# Altium schematic symbol library jlcpcb_2025_04_ferrites_extended_0603.schlib: 833 symbols (part 3 of 4) (continued)
## HCB1608KF-121T20
designator FB?  Impedance @ Frequency: 120Ω@100MHz
Ferrite, 120Ω@100MHz, 2A, SMD 0603; Manufacturer: TAI-TECH; Manufacturer Part Number: HCB1608KF-121T20; Package Size: 0603; JLCPCB Basic Part: No; JLCPCB Part Number: C127301; Supplier 1: LCSC; Category: Ferrite Beads; Supplier Part Number 1: C127301; Rated Current: 2A; RoHS: Yes; ComponentLink1Description: Datasheet; ComponentLink2Description: JLCPCB Part URL; ComponentLink2URL: https://jlcpcb.com/partdetail/C127301; ComponentLink3Description: LCSC Part URL; ComponentLink3URL: https://lcsc.com/product-detail/Ferrite-Beads_TAI-TECH-TAI-TECH-HCB1608KF-121T20_C127301.html
pins: 1, 2

## HCB1608KF-121T30
designator FB?  Impedance @ Frequency: 120Ω@100MHz
Ferrite, 120Ω@100MHz, ±25%, 100mΩ, 3A, SMD 0603; Manufacturer: TAI-TECH; Manufacturer Part Number: HCB1608KF-121T30; Package Size: 0603; JLCPCB Basic Part: No; JLCPCB Part Number: C353920; Supplier 1: LCSC; Category: Ferrite Beads; Supplier Part Number 1: C353920; Tolerance: ±25%; Rated Current: 3A; DC Resistance: 100mΩ; RoHS: Yes; ComponentLink1Description: Datasheet; ComponentLink1URL: https://wmsc.lcsc.com/wmsc/upload/file/pdf/v2/lcsc/2009171106_TAI-TECH-HCB1608KF-121T30_C353920.pdf; ComponentLink2Description: JLCPCB Part URL; ComponentLink2URL: https://jlcpcb.com/partdetail/C353920; ComponentLink3Description: LCSC Part URL; ComponentLink3URL: https://lcsc.com/product-detail/Ferrite-Beads_TAI-TECH-TAI-TECH-HCB1608KF-121T30_C353920.html
footprint FB-0603 (0603 (1608M) Ferrite)
pins: 1, 2

## HCB1608KF-151T20
designator FB?  Impedance @ Frequency: 150Ω@100MHz
Ferrite, 150Ω@100MHz, ±25%, 100mΩ, 2A, SMD 0603; Manufacturer: TAI-TECH; Manufacturer Part Number: HCB1608KF-151T20; Package Size: 0603; JLCPCB Basic Part: No; JLCPCB Part Number: C356965; Supplier 1: LCSC; Category: Ferrite Beads; Supplier Part Number 1: C356965; Tolerance: ±25%; Rated Current: 2A; DC Resistance: 100mΩ; RoHS: Yes; ComponentLink1Description: Datasheet; ComponentLink1URL: https://wmsc.lcsc.com/wmsc/upload/file/pdf/v2/lcsc/2009171138_TAI-TECH-HCB1608KF-151T20_C356965.pdf; ComponentLink2Description: JLCPCB Part URL; ComponentLink2URL: https://jlcpcb.com/partdetail/C356965; ComponentLink3Description: LCSC Part URL; ComponentLink3URL: https://lcsc.com/product-detail/Ferrite-Beads_TAI-TECH-TAI-TECH-HCB1608KF-151T20_C356965.html
footprint FB-0603 (0603 (1608M) Ferrite)
pins: 1, 2

## HCB1608KF-181T20
designator FB?  Impedance @ Frequency: 180Ω@100MHz
Ferrite, 180Ω@100MHz, ±25%, 100mΩ, 2A, SMD 0603; Manufacturer: TAI-TECH; Manufacturer Part Number: HCB1608KF-181T20; Package Size: 0603; JLCPCB Basic Part: No; JLCPCB Part Number: C356967; Supplier 1: LCSC; Category: Ferrite Beads; Supplier Part Number 1: C356967; Tolerance: ±25%; Rated Current: 2A; DC Resistance: 100mΩ; RoHS: Yes; ComponentLink1Description: Datasheet; ComponentLink1URL: https://wmsc.lcsc.com/wmsc/upload/file/pdf/v2/lcsc/2009171138_TAI-TECH-HCB1608KF-181T20_C356967.pdf; ComponentLink2Description: JLCPCB Part URL; ComponentLink2URL: https://jlcpcb.com/partdetail/C356967; ComponentLink3Description: LCSC Part URL; ComponentLink3URL: https://lcsc.com/product-detail/Ferrite-Beads_TAI-TECH-TAI-TECH-HCB1608KF-181T20_C356967.html
footprint FB-0603 (0603 (1608M) Ferrite)
pins: 1, 2

## HCB1608KF-190T40
designator FB?  Impedance @ Frequency: 19Ω@100MHz
Ferrite, 19Ω@100MHz, ±25%, 30mΩ, 4A, SMD 0603; Manufacturer: TAI-TECH; Manufacturer Part Number: HCB1608KF-190T40; Package Size: 0603; JLCPCB Basic Part: No; JLCPCB Part Number: C369513; Supplier 1: LCSC; Category: Ferrite Beads; Supplier Part Number 1: C369513; Tolerance: ±25%; Rated Current: 4A; DC Resistance: 30mΩ; RoHS: Yes; ComponentLink1Description: Datasheet; ComponentLink1URL: https://wmsc.lcsc.com/wmsc/upload/file/pdf/v2/lcsc/2009171441_TAI-TECH-HCB1608KF-190T40_C369513.pdf; ComponentLink2Description: JLCPCB Part URL; ComponentLink2URL: https://jlcpcb.com/partdetail/C369513; ComponentLink3Description: LCSC Part URL; ComponentLink3URL: https://lcsc.com/product-detail/Ferrite-Beads_TAI-TECH-TAI-TECH-HCB1608KF-190T40_C369513.html
footprint FB-0603 (0603 (1608M) Ferrite)
pins: 1, 2

## HCB1608KF-221T20
designator FB?  Impedance @ Frequency: 220Ω@100MHz
Ferrite, 220Ω@100MHz, ±25%, 100mΩ, 2A, SMD 0603; Manufacturer: TAI-TECH; Manufacturer Part Number: HCB1608KF-221T20; Package Size: 0603; JLCPCB Basic Part: No; JLCPCB Part Number: C304314; Supplier 1: LCSC; Category: Ferrite Beads; Supplier Part Number 1: C304314; Tolerance: ±25%; Rated Current: 2A; DC Resistance: 100mΩ; RoHS: Yes; ComponentLink1Description: Datasheet; ComponentLink1URL: https://wmsc.lcsc.com/wmsc/upload/file/pdf/v2/lcsc/2009171410_TAI-TECH-HCB1608KF-221T20_C304314.pdf; ComponentLink2Description: JLCPCB Part URL; ComponentLink2URL: https://jlcpcb.com/partdetail/C304314; ComponentLink3Description: LCSC Part URL; ComponentLink3URL: https://lcsc.com/product-detail/Ferrite-Beads_TAI-TECH-TAI-TECH-HCB1608KF-221T20_C304314.html
footprint FB-0603 (0603 (1608M) Ferrite)
pins: 1, 2

## HCB1608KF-300T20
designator FB?  Impedance @ Frequency: 30Ω@100MHz
Ferrite, 30Ω@100MHz, 2A, SMD 0603; Manufacturer: TAI-TECH; Manufacturer Part Number: HCB1608KF-300T20; Package Size: 0603; JLCPCB Basic Part: No; JLCPCB Part Number: C127306; Supplier 1: LCSC; Category: Ferrite Beads; Supplier Part Number 1: C127306; Rated Current: 2A; RoHS: Yes; ComponentLink1Description: Datasheet; ComponentLink2Description: JLCPCB Part URL; ComponentLink2URL: https://jlcpcb.com/partdetail/C127306; ComponentLink3Description: LCSC Part URL; ComponentLink3URL: https://lcsc.com/product-detail/Ferrite-Beads_TAI-TECH-TAI-TECH-HCB1608KF-300T20_C127306.html
pins: 1, 2

## HCB1608KF-300T30
designator FB?  Impedance @ Frequency: 30Ω@100MHz
Ferrite, 30Ω@100MHz, ±25%, 40mΩ, 3A, SMD 0603; Manufacturer: TAI-TECH; Manufacturer Part Number: HCB1608KF-300T30; Package Size: 0603; JLCPCB Basic Part: No; JLCPCB Part Number: C304315; Supplier 1: LCSC; Category: Ferrite Beads; Supplier Part Number 1: C304315; Tolerance: ±25%; Rated Current: 3A; DC Resistance: 40mΩ; RoHS: Yes; ComponentLink1Description: Datasheet; ComponentLink1URL: https://wmsc.lcsc.com/wmsc/upload/file/pdf/v2/lcsc/2009171410_TAI-TECH-HCB1608KF-300T30_C304315.pdf; ComponentLink2Description: JLCPCB Part URL; ComponentLink2URL: https://jlcpcb.com/partdetail/C304315; ComponentLink3Description: LCSC Part URL; ComponentLink3URL: https://lcsc.com/product-detail/Ferrite-Beads_TAI-TECH-TAI-TECH-HCB1608KF-300T30_C304315.html
footprint FB-0603 (0603 (1608M) Ferrite)
pins: 1, 2

## HCB1608KF-300T50
designator FB?  Impedance @ Frequency: 30Ω@100MHz
Ferrite, 30Ω@100MHz, ±25%, 20mΩ, 5A, SMD 0603; Manufacturer: TAI-TECH; Manufacturer Part Number: HCB1608KF-300T50; Package Size: 0603; JLCPCB Basic Part: No; JLCPCB Part Number: C356971; Supplier 1: LCSC; Category: Ferrite Beads; Supplier Part Number 1: C356971; Tolerance: ±25%; Rated Current: 5A; DC Resistance: 20mΩ; RoHS: Yes; ComponentLink1Description: Datasheet; ComponentLink1URL: https://wmsc.lcsc.com/wmsc/upload/file/pdf/v2/lcsc/2009171138_TAI-TECH-HCB1608KF-300T50_C356971.pdf; ComponentLink2Description: JLCPCB Part URL; ComponentLink2URL: https://jlcpcb.com/partdetail/C356971; ComponentLink3Description: LCSC Part URL; ComponentLink3URL: https://lcsc.com/product-detail/Ferrite-Beads_TAI-TECH-TAI-TECH-HCB1608KF-300T50_C356971.html
footprint FB-0603 (0603 (1608M) Ferrite)
pins: 1, 2

## HCB1608KF-301T10
designator FB?  Impedance @ Frequency: 300Ω@100MHz
Ferrite, 300Ω@100MHz, ±25%, 200mΩ, 1A, SMD 0603; Manufacturer: TAI-TECH; Manufacturer Part Number: HCB1608KF-301T10; Package Size: 0603; JLCPCB Basic Part: No; JLCPCB Part Number: C2992341; Supplier 1: LCSC; Category: Ferrite Beads; Supplier Part Number 1: C2992341; Tolerance: ±25%; Rated Current: 1A; DC Resistance: 200mΩ; RoHS: Yes; ComponentLink1Description: Datasheet; ComponentLink2Description: JLCPCB Part URL; ComponentLink2URL: https://jlcpcb.com/partdetail/C2992341; ComponentLink3Description: LCSC Part URL; ComponentLink3URL: https://lcsc.com/product-detail/Ferrite-Beads_TAI-TECH-TAI-TECH-HCB1608KF-301T10_C2992341.html
footprint FB-0603 (0603 (1608M) Ferrite)
pins: 1, 2

## HCB1608KF-301T20
designator FB?  Impedance @ Frequency: 300Ω@100MHz
Ferrite, 300Ω@100MHz, ±25%, 100mΩ, 2A, SMD 0603; Manufacturer: TAI-TECH; Manufacturer Part Number: HCB1608KF-301T20; Package Size: 0603; JLCPCB Basic Part: No; JLCPCB Part Number: C304316; Supplier 1: LCSC; Category: Ferrite Beads; Supplier Part Number 1: C304316; Tolerance: ±25%; Rated Current: 2A; DC Resistance: 100mΩ; RoHS: Yes; ComponentLink1Description: Datasheet; ComponentLink1URL: https://wmsc.lcsc.com/wmsc/upload/file/pdf/v2/lcsc/2009171410_TAI-TECH-HCB1608KF-301T20_C304316.pdf; ComponentLink2Description: JLCPCB Part URL; ComponentLink2URL: https://jlcpcb.com/partdetail/C304316; ComponentLink3Description: LCSC Part URL; ComponentLink3URL: https://lcsc.com/product-detail/Ferrite-Beads_TAI-TECH-TAI-TECH-HCB1608KF-301T20_C304316.html
footprint FB-0603 (0603 (1608M) Ferrite)
pins: 1, 2

## HCB1608KF-331T20
designator FB?  Impedance @ Frequency: 330Ω@100MHz
Ferrite, 330Ω@100MHz, ±25%, 100mΩ, 2A, SMD 0603; Manufacturer: TAI-TECH; Manufacturer Part Number: HCB1608KF-331T20; Package Size: 0603; JLCPCB Basic Part: No; JLCPCB Part Number: C356973; Supplier 1: LCSC; Category: Ferrite Beads; Supplier Part Number 1: C356973; Tolerance: ±25%; Rated Current: 2A; DC Resistance: 100mΩ; RoHS: Yes; ComponentLink1Description: Datasheet; ComponentLink1URL: https://wmsc.lcsc.com/wmsc/upload/file/pdf/v2/lcsc/2009171138_TAI-TECH-HCB1608KF-331T20_C356973.pdf; ComponentLink2Description: JLCPCB Part URL; ComponentLink2URL: https://jlcpcb.com/partdetail/C356973; ComponentLink3Description: LCSC Part URL; ComponentLink3URL: https://lcsc.com/product-detail/Ferrite-Beads_TAI-TECH-TAI-TECH-HCB1608KF-331T20_C356973.html
footprint FB-0603 (0603 (1608M) Ferrite)
pins: 1, 2

## HCB1608KF-391T10
designator FB?  Impedance @ Frequency: 390Ω@100MHz
Ferrite, 390Ω@100MHz, ±25%, 200mΩ, 1A, SMD 0603; Manufacturer: TAI-TECH; Manufacturer Part Number: HCB1608KF-391T10; Package Size: 0603; JLCPCB Basic Part: No; JLCPCB Part Number: C369514; Supplier 1: LCSC; Category: Ferrite Beads; Supplier Part Number 1: C369514; Tolerance: ±25%; Rated Current: 1A; DC Resistance: 200mΩ; RoHS: Yes; ComponentLink1Description: Datasheet; ComponentLink1URL: https://wmsc.lcsc.com/wmsc/upload/file/pdf/v2/lcsc/2009171441_TAI-TECH-HCB1608KF-391T10_C369514.pdf; ComponentLink2Description: JLCPCB Part URL; ComponentLink2URL: https://jlcpcb.com/partdetail/C369514; ComponentLink3Description: LCSC Part URL; ComponentLink3URL: https://lcsc.com/product-detail/Ferrite-Beads_TAI-TECH-TAI-TECH-HCB1608KF-391T10_C369514.html
footprint FB-0603 (0603 (1608M) Ferrite)
pins: 1, 2

## HCB1608KF-401T10
designator FB?  Impedance @ Frequency: 400Ω@100MHz
Ferrite, 400Ω@100MHz, ±25%, 200mΩ, 1A, SMD 0603; Manufacturer: TAI-TECH; Manufacturer Part Number: HCB1608KF-401T10; Package Size: 0603; JLCPCB Basic Part: No; JLCPCB Part Number: C356975; Supplier 1: LCSC; Category: Ferrite Beads; Supplier Part Number 1: C356975; Tolerance: ±25%; Rated Current: 1A; DC Resistance: 200mΩ; RoHS: Yes; ComponentLink1Description: Datasheet; ComponentLink1URL: https://wmsc.lcsc.com/wmsc/upload/file/pdf/v2/lcsc/2009171138_TAI-TECH-HCB1608KF-401T10_C356975.pdf; ComponentLink2Description: JLCPCB Part URL; ComponentLink2URL: https://jlcpcb.com/partdetail/C356975; ComponentLink3Description: LCSC Part URL; ComponentLink3URL: https://lcsc.com/product-detail/Ferrite-Beads_TAI-TECH-TAI-TECH-HCB1608KF-401T10_C356975.html
footprint FB-0603 (0603 (1608M) Ferrite)
pins: 1, 2

## HCB1608KF-470T30
designator FB?  Impedance @ Frequency: 47Ω@100MHz
Ferrite, 47Ω@100MHz, ±25%, 40mΩ, 3A, SMD 0603; Manufacturer: TAI-TECH; Manufacturer Part Number: HCB1608KF-470T30; Package Size: 0603; JLCPCB Basic Part: No; JLCPCB Part Number: C356976; Supplier 1: LCSC; Category: Ferrite Beads; Supplier Part Number 1: C356976; Tolerance: ±25%; Rated Current: 3A; DC Resistance: 40mΩ; RoHS: Yes; ComponentLink1Description: Datasheet; ComponentLink1URL: https://wmsc.lcsc.com/wmsc/upload/file/pdf/v2/lcsc/2009171138_TAI-TECH-HCB1608KF-470T30_C356976.pdf; ComponentLink2Description: JLCPCB Part URL; ComponentLink2URL: https://jlcpcb.com/partdetail/C356976; ComponentLink3Description: LCSC Part URL; ComponentLink3URL: https://lcsc.com/product-detail/Ferrite-Beads_TAI-TECH-TAI-TECH-HCB1608KF-470T30_C356976.html
footprint FB-0603 (0603 (1608M) Ferrite)
pins: 1, 2

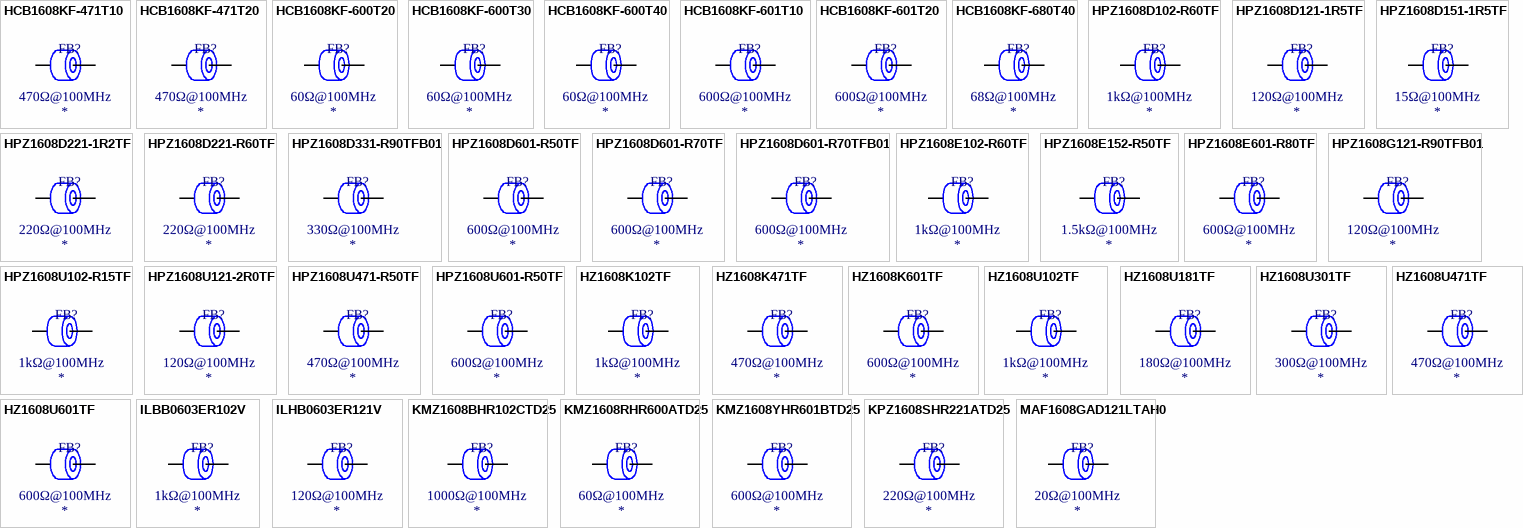
[diagram p12: symbols HCB1608KF-471T10 to MAF1608GAD121LTAH0]

## HCB1608KF-471T10
designator FB?  Impedance @ Frequency: 470Ω@100MHz
Ferrite, 470Ω@100MHz, ±25%, 200mΩ, 1A, SMD 0603; Manufacturer: TAI-TECH; Manufacturer Part Number: HCB1608KF-471T10; Package Size: 0603; JLCPCB Basic Part: No; JLCPCB Part Number: C369515; Supplier 1: LCSC; Category: Ferrite Beads; Supplier Part Number 1: C369515; Tolerance: ±25%; Rated Current: 1A; DC Resistance: 200mΩ; RoHS: Yes; ComponentLink1Description: Datasheet; ComponentLink1URL: https://wmsc.lcsc.com/wmsc/upload/file/pdf/v2/lcsc/2009171441_TAI-TECH-HCB1608KF-471T10_C369515.pdf; ComponentLink2Description: JLCPCB Part URL; ComponentLink2URL: https://jlcpcb.com/partdetail/C369515; ComponentLink3Description: LCSC Part URL; ComponentLink3URL: https://lcsc.com/product-detail/Ferrite-Beads_TAI-TECH-TAI-TECH-HCB1608KF-471T10_C369515.html
footprint FB-0603 (0603 (1608M) Ferrite)
pins: 1, 2

## HCB1608KF-471T20
designator FB?  Impedance @ Frequency: 470Ω@100MHz
Ferrite, 470Ω@100MHz, ±25%, 100mΩ, 2A, SMD 0603; Manufacturer: TAI-TECH; Manufacturer Part Number: HCB1608KF-471T20; Package Size: 0603; JLCPCB Basic Part: No; JLCPCB Part Number: C356977; Supplier 1: LCSC; Category: Ferrite Beads; Supplier Part Number 1: C356977; Tolerance: ±25%; Rated Current: 2A; DC Resistance: 100mΩ; RoHS: Yes; ComponentLink1Description: Datasheet; ComponentLink1URL: https://wmsc.lcsc.com/wmsc/upload/file/pdf/v2/lcsc/2009171138_TAI-TECH-HCB1608KF-471T20_C356977.pdf; ComponentLink2Description: JLCPCB Part URL; ComponentLink2URL: https://jlcpcb.com/partdetail/C356977; ComponentLink3Description: LCSC Part URL; ComponentLink3URL: https://lcsc.com/product-detail/Ferrite-Beads_TAI-TECH-TAI-TECH-HCB1608KF-471T20_C356977.html
footprint FB-0603 (0603 (1608M) Ferrite)
pins: 1, 2

## HCB1608KF-600T20
designator FB?  Impedance @ Frequency: 60Ω@100MHz
Ferrite, 60Ω@100MHz, ±25%, 100mΩ, 2A, SMD 0603; Manufacturer: TAI-TECH; Manufacturer Part Number: HCB1608KF-600T20; Package Size: 0603; JLCPCB Basic Part: No; JLCPCB Part Number: C369516; Supplier 1: LCSC; Category: Ferrite Beads; Supplier Part Number 1: C369516; Tolerance: ±25%; Rated Current: 2A; DC Resistance: 100mΩ; RoHS: Yes; ComponentLink1Description: Datasheet; ComponentLink1URL: https://wmsc.lcsc.com/wmsc/upload/file/pdf/v2/lcsc/2009171441_TAI-TECH-HCB1608KF-600T20_C369516.pdf; ComponentLink2Description: JLCPCB Part URL; ComponentLink2URL: https://jlcpcb.com/partdetail/C369516; ComponentLink3Description: LCSC Part URL; ComponentLink3URL: https://lcsc.com/product-detail/Ferrite-Beads_TAI-TECH-TAI-TECH-HCB1608KF-600T20_C369516.html
footprint FB-0603 (0603 (1608M) Ferrite)
pins: 1, 2

## HCB1608KF-600T30
designator FB?  Impedance @ Frequency: 60Ω@100MHz
Ferrite, 60Ω@100MHz, ±25%, 40mΩ, 3A, SMD 0603; Manufacturer: TAI-TECH; Manufacturer Part Number: HCB1608KF-600T30; Package Size: 0603; JLCPCB Basic Part: No; JLCPCB Part Number: C304317; Supplier 1: LCSC; Category: Ferrite Beads; Supplier Part Number 1: C304317; Tolerance: ±25%; Rated Current: 3A; DC Resistance: 40mΩ; RoHS: Yes; ComponentLink1Description: Datasheet; ComponentLink1URL: https://wmsc.lcsc.com/wmsc/upload/file/pdf/v2/lcsc/2009171410_TAI-TECH-HCB1608KF-600T30_C304317.pdf; ComponentLink2Description: JLCPCB Part URL; ComponentLink2URL: https://jlcpcb.com/partdetail/C304317; ComponentLink3Description: LCSC Part URL; ComponentLink3URL: https://lcsc.com/product-detail/Ferrite-Beads_TAI-TECH-TAI-TECH-HCB1608KF-600T30_C304317.html
footprint FB-0603 (0603 (1608M) Ferrite)
pins: 1, 2

## HCB1608KF-600T40
designator FB?  Impedance @ Frequency: 60Ω@100MHz
Ferrite, 60Ω@100MHz, ±25%, 30mΩ, 4A, SMD 0603; Manufacturer: TAI-TECH; Manufacturer Part Number: HCB1608KF-600T40; Package Size: 0603; JLCPCB Basic Part: No; JLCPCB Part Number: C356980; Supplier 1: LCSC; Category: Ferrite Beads; Supplier Part Number 1: C356980; Tolerance: ±25%; Rated Current: 4A; DC Resistance: 30mΩ; RoHS: Yes; ComponentLink1Description: Datasheet; ComponentLink1URL: https://wmsc.lcsc.com/wmsc/upload/file/pdf/v2/lcsc/2009171138_TAI-TECH-HCB1608KF-600T40_C356980.pdf; ComponentLink2Description: JLCPCB Part URL; ComponentLink2URL: https://jlcpcb.com/partdetail/C356980; ComponentLink3Description: LCSC Part URL; ComponentLink3URL: https://lcsc.com/product-detail/Ferrite-Beads_TAI-TECH-TAI-TECH-HCB1608KF-600T40_C356980.html
footprint FB-0603 (0603 (1608M) Ferrite)
pins: 1, 2

## HCB1608KF-601T10
designator FB?  Impedance @ Frequency: 600Ω@100MHz
Ferrite, 600Ω@100MHz, ±25%, 200mΩ, 1A, SMD 0603; Manufacturer: TAI-TECH; Manufacturer Part Number: HCB1608KF-601T10; Package Size: 0603; JLCPCB Basic Part: No; JLCPCB Part Number: C304318; Supplier 1: LCSC; Category: Ferrite Beads; Supplier Part Number 1: C304318; Tolerance: ±25%; Rated Current: 1A; DC Resistance: 200mΩ; RoHS: Yes; ComponentLink1Description: Datasheet; ComponentLink1URL: https://wmsc.lcsc.com/wmsc/upload/file/pdf/v2/lcsc/2009171411_TAI-TECH-HCB1608KF-601T10_C304318.pdf; ComponentLink2Description: JLCPCB Part URL; ComponentLink2URL: https://jlcpcb.com/partdetail/C304318; ComponentLink3Description: LCSC Part URL; ComponentLink3URL: https://lcsc.com/product-detail/Ferrite-Beads_TAI-TECH-TAI-TECH-HCB1608KF-601T10_C304318.html
footprint FB-0603 (0603 (1608M) Ferrite)
pins: 1, 2

## HCB1608KF-601T20
designator FB?  Impedance @ Frequency: 600Ω@100MHz
Ferrite, 600Ω@100MHz, ±25%, 100mΩ, 2A, SMD 0603; Manufacturer: TAI-TECH; Manufacturer Part Number: HCB1608KF-601T20; Package Size: 0603; JLCPCB Basic Part: No; JLCPCB Part Number: C304319; Supplier 1: LCSC; Category: Ferrite Beads; Supplier Part Number 1: C304319; Tolerance: ±25%; Rated Current: 2A; DC Resistance: 100mΩ; RoHS: Yes; ComponentLink1Description: Datasheet; ComponentLink1URL: https://wmsc.lcsc.com/wmsc/upload/file/pdf/v2/lcsc/2009171411_TAI-TECH-HCB1608KF-601T20_C304319.pdf; ComponentLink2Description: JLCPCB Part URL; ComponentLink2URL: https://jlcpcb.com/partdetail/C304319; ComponentLink3Description: LCSC Part URL; ComponentLink3URL: https://lcsc.com/product-detail/Ferrite-Beads_TAI-TECH-TAI-TECH-HCB1608KF-601T20_C304319.html
footprint FB-0603 (0603 (1608M) Ferrite)
pins: 1, 2

## HCB1608KF-680T40
designator FB?  Impedance @ Frequency: 68Ω@100MHz
Ferrite, 68Ω@100MHz, ±25%, 30mΩ, 4A, SMD 0603; Manufacturer: TAI-TECH; Manufacturer Part Number: HCB1608KF-680T40; Package Size: 0603; JLCPCB Basic Part: No; JLCPCB Part Number: C356982; Supplier 1: LCSC; Category: Ferrite Beads; Supplier Part Number 1: C356982; Tolerance: ±25%; Rated Current: 4A; DC Resistance: 30mΩ; RoHS: Yes; ComponentLink1Description: Datasheet; ComponentLink1URL: https://wmsc.lcsc.com/wmsc/upload/file/pdf/v2/lcsc/2009171138_TAI-TECH-HCB1608KF-680T40_C356982.pdf; ComponentLink2Description: JLCPCB Part URL; ComponentLink2URL: https://jlcpcb.com/partdetail/C356982; ComponentLink3Description: LCSC Part URL; ComponentLink3URL: https://lcsc.com/product-detail/Ferrite-Beads_TAI-TECH-TAI-TECH-HCB1608KF-680T40_C356982.html
footprint FB-0603 (0603 (1608M) Ferrite)
pins: 1, 2

## HPZ1608D102-R60TF
designator FB?  Impedance @ Frequency: 1kΩ@100MHz
Ferrite, 1kΩ@100MHz, ±25%, 350mΩ, 600mA, SMD 0603; Manufacturer: Sunlord; Manufacturer Part Number: HPZ1608D102-R60TF; Package Size: 0603; JLCPCB Basic Part: No; JLCPCB Part Number: C185888; Supplier 1: LCSC; Category: Ferrite Beads; Supplier Part Number 1: C185888; Tolerance: ±25%; Rated Current: 600mA; DC Resistance: 350mΩ; RoHS: Yes; ComponentLink1Description: Datasheet; ComponentLink1URL: https://wmsc.lcsc.com/wmsc/upload/file/pdf/v2/lcsc/2310301640_Sunlord-HPZ1608D102-R60TF_C185888.pdf; ComponentLink2Description: JLCPCB Part URL; ComponentLink2URL: https://jlcpcb.com/partdetail/C185888; ComponentLink3Description: LCSC Part URL; ComponentLink3URL: https://lcsc.com/product-detail/Ferrite-Beads_Sunlord-Sunlord-HPZ1608D102-R60TF_C185888.html
footprint FB-0603 (0603 (1608M) Ferrite)
pins: 1, 2

## HPZ1608D121-1R5TF
designator FB?  Impedance @ Frequency: 120Ω@100MHz
Ferrite, 120Ω@100MHz, ±25%, 70mΩ, 1.5A, SMD 0603; Manufacturer: Sunlord; Manufacturer Part Number: HPZ1608D121-1R5TF; Package Size: 0603; JLCPCB Basic Part: No; JLCPCB Part Number: C185887; Supplier 1: LCSC; Category: Ferrite Beads; Supplier Part Number 1: C185887; Tolerance: ±25%; Rated Current: 1.5A; DC Resistance: 70mΩ; RoHS: Yes; ComponentLink1Description: Datasheet; ComponentLink1URL: https://wmsc.lcsc.com/wmsc/upload/file/pdf/v2/lcsc/2310301640_Sunlord-HPZ1608D121-1R5TF_C185887.pdf; ComponentLink2Description: JLCPCB Part URL; ComponentLink2URL: https://jlcpcb.com/partdetail/C185887; ComponentLink3Description: LCSC Part URL; ComponentLink3URL: https://lcsc.com/product-detail/Ferrite-Beads_Sunlord-Sunlord-HPZ1608D121-1R5TF_C185887.html
footprint FB-0603 (0603 (1608M) Ferrite)
pins: 1, 2

## HPZ1608D151-1R5TF
designator FB?  Impedance @ Frequency: 15Ω@100MHz
Ferrite, 15Ω@100MHz, ±25%, 70mΩ, 1.5A, SMD 0603; Manufacturer: Sunlord; Manufacturer Part Number: HPZ1608D151-1R5TF; Package Size: 0603; JLCPCB Basic Part: No; JLCPCB Part Number: C185877; Supplier 1: LCSC; Category: Ferrite Beads; Supplier Part Number 1: C185877; Tolerance: ±25%; Rated Current: 1.5A; DC Resistance: 70mΩ; RoHS: Yes; ComponentLink1Description: Datasheet; ComponentLink1URL: https://wmsc.lcsc.com/wmsc/upload/file/pdf/v2/lcsc/2310301640_Sunlord-HPZ1608D151-1R5TF_C185877.pdf; ComponentLink2Description: JLCPCB Part URL; ComponentLink2URL: https://jlcpcb.com/partdetail/C185877; ComponentLink3Description: LCSC Part URL; ComponentLink3URL: https://lcsc.com/product-detail/Ferrite-Beads_Sunlord-Sunlord-HPZ1608D151-1R5TF_C185877.html
footprint FB-0603 (0603 (1608M) Ferrite)
pins: 1, 2

## HPZ1608D221-1R2TF
designator FB?  Impedance @ Frequency: 220Ω@100MHz
Ferrite, 220Ω@100MHz, ±25%, 120mΩ, 1.2A, SMD 0603; Manufacturer: Sunlord; Manufacturer Part Number: HPZ1608D221-1R2TF; Package Size: 0603; JLCPCB Basic Part: No; JLCPCB Part Number: C154132; Supplier 1: LCSC; Category: Ferrite Beads; Supplier Part Number 1: C154132; Tolerance: ±25%; Rated Current: 1.2A; DC Resistance: 120mΩ; RoHS: Yes; ComponentLink1Description: Datasheet; ComponentLink1URL: https://wmsc.lcsc.com/wmsc/upload/file/pdf/v2/lcsc/2310301640_Sunlord-HPZ1608D221-1R2TF_C154132.pdf; ComponentLink2Description: JLCPCB Part URL; ComponentLink2URL: https://jlcpcb.com/partdetail/C154132; ComponentLink3Description: LCSC Part URL; ComponentLink3URL: https://lcsc.com/product-detail/Ferrite-Beads_Sunlord-Sunlord-HPZ1608D221-1R2TF_C154132.html
footprint FB-0603 (0603 (1608M) Ferrite)
pins: 1, 2

## HPZ1608D221-R60TF
designator FB?  Impedance @ Frequency: 220Ω@100MHz
Ferrite, 220Ω@100MHz, ±25%, 250mΩ, 600mA, SMD 0603; Manufacturer: Sunlord; Manufacturer Part Number: HPZ1608D221-R60TF; Package Size: 0603; JLCPCB Basic Part: No; JLCPCB Part Number: C369804; Supplier 1: LCSC; Category: Ferrite Beads; Supplier Part Number 1: C369804; Tolerance: ±25%; Rated Current: 600mA; DC Resistance: 250mΩ; RoHS: Yes; ComponentLink1Description: Datasheet; ComponentLink1URL: https://wmsc.lcsc.com/wmsc/upload/file/pdf/v2/lcsc/2310301640_Sunlord-HPZ1608D221-R60TF_C369804.pdf; ComponentLink2Description: JLCPCB Part URL; ComponentLink2URL: https://jlcpcb.com/partdetail/C369804; ComponentLink3Description: LCSC Part URL; ComponentLink3URL: https://lcsc.com/product-detail/Ferrite-Beads_Sunlord-Sunlord-HPZ1608D221-R60TF_C369804.html
footprint FB-0603 (0603 (1608M) Ferrite)
pins: 1, 2

## HPZ1608D331-R90TFB01
designator FB?  Impedance @ Frequency: 330Ω@100MHz
Ferrite, 330Ω@100MHz, ±25%, 150mΩ, 900mA, SMD 0603; Manufacturer: Sunlord; Manufacturer Part Number: HPZ1608D331-R90TFB01; Package Size: 0603; JLCPCB Basic Part: No; JLCPCB Part Number: C369805; Supplier 1: LCSC; Category: Ferrite Beads; Supplier Part Number 1: C369805; Tolerance: ±25%; Rated Current: 900mA; DC Resistance: 150mΩ; RoHS: Yes; ComponentLink1Description: Datasheet; ComponentLink1URL: https://wmsc.lcsc.com/wmsc/upload/file/pdf/v2/lcsc/2310301640_Sunlord-HPZ1608D331-R90TFB01_C369805.pdf; ComponentLink2Description: JLCPCB Part URL; ComponentLink2URL: https://jlcpcb.com/partdetail/C369805; ComponentLink3Description: LCSC Part URL; ComponentLink3URL: https://lcsc.com/product-detail/Ferrite-Beads_Sunlord-Sunlord-HPZ1608D331-R90TFB01_C369805.html
footprint FB-0603 (0603 (1608M) Ferrite)
pins: 1, 2

## HPZ1608D601-R50TF
designator FB?  Impedance @ Frequency: 600Ω@100MHz
Ferrite, 600Ω@100MHz, ±25%, 500mA, SMD 0603; Manufacturer: Sunlord; Manufacturer Part Number: HPZ1608D601-R50TF; Package Size: 0603; JLCPCB Basic Part: No; JLCPCB Part Number: C725352; Supplier 1: LCSC; Category: Ferrite Beads; Supplier Part Number 1: C725352; Tolerance: ±25%; Rated Current: 500mA; RoHS: Yes; ComponentLink1Description: Datasheet; ComponentLink1URL: https://wmsc.lcsc.com/wmsc/upload/file/pdf/v2/lcsc/2310301640_Sunlord-HPZ1608D601-R50TF_C725352.pdf; ComponentLink2Description: JLCPCB Part URL; ComponentLink2URL: https://jlcpcb.com/partdetail/C725352; ComponentLink3Description: LCSC Part URL; ComponentLink3URL: https://lcsc.com/product-detail/Ferrite-Beads_Sunlord-Sunlord-HPZ1608D601-R50TF_C725352.html
pins: 1, 2

## HPZ1608D601-R70TF
designator FB?  Impedance @ Frequency: 600Ω@100MHz
Ferrite, 600Ω@100MHz, ±25%, 700mA, SMD 0603; Manufacturer: Sunlord; Manufacturer Part Number: HPZ1608D601-R70TF; Package Size: 0603; JLCPCB Basic Part: No; JLCPCB Part Number: C919152; Supplier 1: LCSC; Category: Ferrite Beads; Supplier Part Number 1: C919152; Tolerance: ±25%; Rated Current: 700mA; RoHS: Yes; ComponentLink1Description: Datasheet; ComponentLink1URL: https://wmsc.lcsc.com/wmsc/upload/file/pdf/v2/lcsc/2310301640_Sunlord-HPZ1608D601-R70TF_C919152.pdf; ComponentLink2Description: JLCPCB Part URL; ComponentLink2URL: https://jlcpcb.com/partdetail/C919152; ComponentLink3Description: LCSC Part URL; ComponentLink3URL: https://lcsc.com/product-detail/Ferrite-Beads_Sunlord-Sunlord-HPZ1608D601-R70TF_C919152.html
pins: 1, 2

## HPZ1608D601-R70TFB01
designator FB?  Impedance @ Frequency: 600Ω@100MHz
Ferrite, 600Ω@100MHz, ±25%, 240mΩ, 700mA, SMD 0603; Manufacturer: Sunlord; Manufacturer Part Number: HPZ1608D601-R70TFB01; Package Size: 0603; JLCPCB Basic Part: No; JLCPCB Part Number: C154133; Supplier 1: LCSC; Category: Ferrite Beads; Supplier Part Number 1: C154133; Tolerance: ±25%; Rated Current: 700mA; DC Resistance: 240mΩ; RoHS: Yes; ComponentLink1Description: Datasheet; ComponentLink1URL: https://wmsc.lcsc.com/wmsc/upload/file/pdf/v2/lcsc/2310301640_Sunlord-HPZ1608D601-R70TFB01_C154133.pdf; ComponentLink2Description: JLCPCB Part URL; ComponentLink2URL: https://jlcpcb.com/partdetail/C154133; ComponentLink3Description: LCSC Part URL; ComponentLink3URL: https://lcsc.com/product-detail/Ferrite-Beads_Sunlord-Sunlord-HPZ1608D601-R70TFB01_C154133.html
footprint FB-0603 (0603 (1608M) Ferrite)
pins: 1, 2

## HPZ1608E102-R60TF
designator FB?  Impedance @ Frequency: 1kΩ@100MHz
Ferrite, 1kΩ@100MHz, ±25%, 350mΩ, 600mA, SMD 0603; Manufacturer: Sunlord; Manufacturer Part Number: HPZ1608E102-R60TF; Package Size: 0603; JLCPCB Basic Part: No; JLCPCB Part Number: C334246; Supplier 1: LCSC; Category: Ferrite Beads; Supplier Part Number 1: C334246; Tolerance: ±25%; Rated Current: 600mA; DC Resistance: 350mΩ; RoHS: Yes; ComponentLink1Description: Datasheet; ComponentLink1URL: https://wmsc.lcsc.com/wmsc/upload/file/pdf/v2/lcsc/2310301640_Sunlord-HPZ1608E102-R60TF_C334246.pdf; ComponentLink2Description: JLCPCB Part URL; ComponentLink2URL: https://jlcpcb.com/partdetail/C334246; ComponentLink3Description: LCSC Part URL; ComponentLink3URL: https://lcsc.com/product-detail/Ferrite-Beads_Sunlord-Sunlord-HPZ1608E102-R60TF_C334246.html
footprint FB-0603 (0603 (1608M) Ferrite)
pins: 1, 2

## HPZ1608E152-R50TF
designator FB?  Impedance @ Frequency: 1.5kΩ@100MHz
Ferrite, 1.5kΩ@100MHz, ±25%, 500mΩ, 500mA, SMD 0603; Manufacturer: Sunlord; Manufacturer Part Number: HPZ1608E152-R50TF; Package Size: 0603; JLCPCB Basic Part: No; JLCPCB Part Number: C341252; Supplier 1: LCSC; Category: Ferrite Beads; Supplier Part Number 1: C341252; Tolerance: ±25%; Rated Current: 500mA; DC Resistance: 500mΩ; RoHS: Yes; ComponentLink1Description: Datasheet; ComponentLink1URL: https://wmsc.lcsc.com/wmsc/upload/file/pdf/v2/lcsc/2310301640_Sunlord-HPZ1608E152-R50TF_C341252.pdf; ComponentLink2Description: JLCPCB Part URL; ComponentLink2URL: https://jlcpcb.com/partdetail/C341252; ComponentLink3Description: LCSC Part URL; ComponentLink3URL: https://lcsc.com/product-detail/Ferrite-Beads_Sunlord-Sunlord-HPZ1608E152-R50TF_C341252.html
footprint FB-0603 (0603 (1608M) Ferrite)
pins: 1, 2

## HPZ1608E601-R80TF
designator FB?  Impedance @ Frequency: 600Ω@100MHz
Ferrite, 600Ω@100MHz, ±25%, 0.25Ω, 0.8A, SMD 0603; Manufacturer: Sunlord; Manufacturer Part Number: HPZ1608E601-R80TF; Package Size: 0603; JLCPCB Basic Part: No; JLCPCB Part Number: C2988086; Supplier 1: LCSC; Category: Ferrite Beads; Supplier Part Number 1: C2988086; Tolerance: ±25%; Rated Current: 0.8A; DC Resistance: 0.25Ω; RoHS: Yes; ComponentLink1Description: Datasheet; ComponentLink1URL: https://wmsc.lcsc.com/wmsc/upload/file/pdf/v2/lcsc/2310301640_Sunlord-HPZ1608E601-R80TF_C2988086.pdf; ComponentLink2Description: JLCPCB Part URL; ComponentLink2URL: https://jlcpcb.com/partdetail/C2988086; ComponentLink3Description: LCSC Part URL; ComponentLink3URL: https://lcsc.com/product-detail/Ferrite-Beads_Sunlord-Sunlord-HPZ1608E601-R80TF_C2988086.html
footprint FB-0603 (0603 (1608M) Ferrite)
pins: 1, 2

## HPZ1608G121-R90TFB01
designator FB?  Impedance @ Frequency: 120Ω@100MHz
Ferrite, 120Ω@100MHz, ±25%, 130mΩ, 900mA, SMD 0603; Manufacturer: Sunlord; Manufacturer Part Number: HPZ1608G121-R90TFB01; Package Size: 0603; JLCPCB Basic Part: No; JLCPCB Part Number: C154131; Supplier 1: LCSC; Category: Ferrite Beads; Supplier Part Number 1: C154131; Tolerance: ±25%; Rated Current: 900mA; DC Resistance: 130mΩ; RoHS: Yes; ComponentLink1Description: Datasheet; ComponentLink1URL: https://wmsc.lcsc.com/wmsc/upload/file/pdf/v2/lcsc/2310301640_Sunlord-HPZ1608G121-R90TFB01_C154131.pdf; ComponentLink2Description: JLCPCB Part URL; ComponentLink2URL: https://jlcpcb.com/partdetail/C154131; ComponentLink3Description: LCSC Part URL; ComponentLink3URL: https://lcsc.com/product-detail/Ferrite-Beads_Sunlord-Sunlord-HPZ1608G121-R90TFB01_C154131.html
footprint FB-0603 (0603 (1608M) Ferrite)
pins: 1, 2

## HPZ1608U102-R15TF
designator FB?  Impedance @ Frequency: 1kΩ@100MHz
Ferrite, 1kΩ@100MHz, ±25%, 900mΩ, 150mA, SMD 0603; Manufacturer: Sunlord; Manufacturer Part Number: HPZ1608U102-R15TF; Package Size: 0603; JLCPCB Basic Part: No; JLCPCB Part Number: C369806; Supplier 1: LCSC; Category: Ferrite Beads; Supplier Part Number 1: C369806; Tolerance: ±25%; Rated Current: 150mA; DC Resistance: 900mΩ; RoHS: Yes; ComponentLink1Description: Datasheet; ComponentLink1URL: https://wmsc.lcsc.com/wmsc/upload/file/pdf/v2/lcsc/2310301640_Sunlord-HPZ1608U102-R15TF_C369806.pdf; ComponentLink2Description: JLCPCB Part URL; ComponentLink2URL: https://jlcpcb.com/partdetail/C369806; ComponentLink3Description: LCSC Part URL; ComponentLink3URL: https://lcsc.com/product-detail/Ferrite-Beads_Sunlord-Sunlord-HPZ1608U102-R15TF_C369806.html
footprint FB-0603 (0603 (1608M) Ferrite)
pins: 1, 2

## HPZ1608U121-2R0TF
designator FB?  Impedance @ Frequency: 120Ω@100MHz
Ferrite, 120Ω@100MHz, ±25%, 55mΩ, 2A, SMD 0603; Manufacturer: Sunlord; Manufacturer Part Number: HPZ1608U121-2R0TF; Package Size: 0603; JLCPCB Basic Part: No; JLCPCB Part Number: C919153; Supplier 1: LCSC; Category: Ferrite Beads; Supplier Part Number 1: C919153; Tolerance: ±25%; Rated Current: 2A; DC Resistance: 55mΩ; RoHS: Yes; ComponentLink1Description: Datasheet; ComponentLink1URL: https://wmsc.lcsc.com/wmsc/upload/file/pdf/v2/lcsc/2310301640_Sunlord-HPZ1608U121-2R0TF_C919153.pdf; ComponentLink2Description: JLCPCB Part URL; ComponentLink2URL: https://jlcpcb.com/partdetail/C919153; ComponentLink3Description: LCSC Part URL; ComponentLink3URL: https://lcsc.com/product-detail/Ferrite-Beads_Sunlord-Sunlord-HPZ1608U121-2R0TF_C919153.html
footprint FB-0603 (0603 (1608M) Ferrite)
pins: 1, 2

## HPZ1608U471-R50TF
designator FB?  Impedance @ Frequency: 470Ω@100MHz
Ferrite, 470Ω@100MHz, ±25%, 320mΩ, 500mA, SMD 0603; Manufacturer: Sunlord; Manufacturer Part Number: HPZ1608U471-R50TF; Package Size: 0603; JLCPCB Basic Part: No; JLCPCB Part Number: C334247; Supplier 1: LCSC; Category: Ferrite Beads; Supplier Part Number 1: C334247; Tolerance: ±25%; Rated Current: 500mA; DC Resistance: 320mΩ; RoHS: Yes; ComponentLink1Description: Datasheet; ComponentLink1URL: https://wmsc.lcsc.com/wmsc/upload/file/pdf/v2/lcsc/2310301640_Sunlord-HPZ1608U471-R50TF_C334247.pdf; ComponentLink2Description: JLCPCB Part URL; ComponentLink2URL: https://jlcpcb.com/partdetail/C334247; ComponentLink3Description: LCSC Part URL; ComponentLink3URL: https://lcsc.com/product-detail/Ferrite-Beads_Sunlord-Sunlord-HPZ1608U471-R50TF_C334247.html
footprint FB-0603 (0603 (1608M) Ferrite)
pins: 1, 2

## HPZ1608U601-R50TF
designator FB?  Impedance @ Frequency: 600Ω@100MHz
Ferrite, 600Ω@100MHz, ±25%, 350mΩ, 500mA, SMD 0603; Manufacturer: Sunlord; Manufacturer Part Number: HPZ1608U601-R50TF; Package Size: 0603; JLCPCB Basic Part: No; JLCPCB Part Number: C279560; Supplier 1: LCSC; Category: Ferrite Beads; Supplier Part Number 1: C279560; Tolerance: ±25%; Rated Current: 500mA; DC Resistance: 350mΩ; RoHS: Yes; ComponentLink1Description: Datasheet; ComponentLink1URL: https://wmsc.lcsc.com/wmsc/upload/file/pdf/v2/lcsc/2310301640_Sunlord-HPZ1608U601-R50TF_C279560.pdf; ComponentLink2Description: JLCPCB Part URL; ComponentLink2URL: https://jlcpcb.com/partdetail/C279560; ComponentLink3Description: LCSC Part URL; ComponentLink3URL: https://lcsc.com/product-detail/Ferrite-Beads_Sunlord-Sunlord-HPZ1608U601-R50TF_C279560.html
footprint FB-0603 (0603 (1608M) Ferrite)
pins: 1, 2

## HZ1608K102TF
designator FB?  Impedance @ Frequency: 1kΩ@100MHz
Ferrite, 1kΩ@100MHz, ±25%, 1.8Ω, 50mA, SMD 0603; Manufacturer: Sunlord; Manufacturer Part Number: HZ1608K102TF; Package Size: 0603; JLCPCB Basic Part: No; JLCPCB Part Number: C154121; Supplier 1: LCSC; Category: Ferrite Beads; Supplier Part Number 1: C154121; Tolerance: ±25%; Rated Current: 50mA; DC Resistance: 1.8Ω; RoHS: Yes; ComponentLink1Description: Datasheet; ComponentLink1URL: https://wmsc.lcsc.com/wmsc/upload/file/pdf/v2/lcsc/2310301640_Sunlord-HZ1608K102TF_C154121.pdf; ComponentLink2Description: JLCPCB Part URL; ComponentLink2URL: https://jlcpcb.com/partdetail/C154121; ComponentLink3Description: LCSC Part URL; ComponentLink3URL: https://lcsc.com/product-detail/Ferrite-Beads_Sunlord-Sunlord-HZ1608K102TF_C154121.html
footprint FB-0603 (0603 (1608M) Ferrite)
pins: 1, 2

## HZ1608K471TF
designator FB?  Impedance @ Frequency: 470Ω@100MHz
Ferrite, 470Ω@100MHz, ±25%, 1.2Ω, 100mA, SMD 0603; Manufacturer: Sunlord; Manufacturer Part Number: HZ1608K471TF; Package Size: 0603; JLCPCB Basic Part: No; JLCPCB Part Number: C370007; Supplier 1: LCSC; Category: Ferrite Beads; Supplier Part Number 1: C370007; Tolerance: ±25%; Rated Current: 100mA; DC Resistance: 1.2Ω; RoHS: Yes; ComponentLink1Description: Datasheet; ComponentLink1URL: https://wmsc.lcsc.com/wmsc/upload/file/pdf/v2/lcsc/2310301640_Sunlord-HZ1608K471TF_C370007.pdf; ComponentLink2Description: JLCPCB Part URL; ComponentLink2URL: https://jlcpcb.com/partdetail/C370007; ComponentLink3Description: LCSC Part URL; ComponentLink3URL: https://lcsc.com/product-detail/Ferrite-Beads_Sunlord-Sunlord-HZ1608K471TF_C370007.html
footprint FB-0603 (0603 (1608M) Ferrite)
pins: 1, 2

## HZ1608K601TF
designator FB?  Impedance @ Frequency: 600Ω@100MHz
Ferrite, 600Ω@100MHz, ±25%, 1.5Ω, 100mA, SMD 0603; Manufacturer: Sunlord; Manufacturer Part Number: HZ1608K601TF; Package Size: 0603; JLCPCB Basic Part: No; JLCPCB Part Number: C154122; Supplier 1: LCSC; Category: Ferrite Beads; Supplier Part Number 1: C154122; Tolerance: ±25%; Rated Current: 100mA; DC Resistance: 1.5Ω; RoHS: Yes; ComponentLink1Description: Datasheet; ComponentLink1URL: https://wmsc.lcsc.com/wmsc/upload/file/pdf/v2/lcsc/2310301640_Sunlord-HZ1608K601TF_C154122.pdf; ComponentLink2Description: JLCPCB Part URL; ComponentLink2URL: https://jlcpcb.com/partdetail/C154122; ComponentLink3Description: LCSC Part URL; ComponentLink3URL: https://lcsc.com/product-detail/Ferrite-Beads_Sunlord-Sunlord-HZ1608K601TF_C154122.html
footprint FB-0603 (0603 (1608M) Ferrite)
pins: 1, 2

## HZ1608U102TF
designator FB?  Impedance @ Frequency: 1kΩ@100MHz
Ferrite, 1kΩ@100MHz, ±25%, 1.6Ω, 100mA, SMD 0603; Manufacturer: Sunlord; Manufacturer Part Number: HZ1608U102TF; Package Size: 0603; JLCPCB Basic Part: No; JLCPCB Part Number: C98298; Supplier 1: LCSC; Category: Ferrite Beads; Supplier Part Number 1: C98298; Tolerance: ±25%; Rated Current: 100mA; DC Resistance: 1.6Ω; RoHS: Yes; ComponentLink1Description: Datasheet; ComponentLink1URL: https://wmsc.lcsc.com/wmsc/upload/file/pdf/v2/lcsc/2310301640_Sunlord-HZ1608U102TF_C98298.pdf; ComponentLink2Description: JLCPCB Part URL; ComponentLink2URL: https://jlcpcb.com/partdetail/C98298; ComponentLink3Description: LCSC Part URL; ComponentLink3URL: https://lcsc.com/product-detail/Ferrite-Beads_Sunlord-Sunlord-HZ1608U102TF_C98298.html
footprint FB-0603 (0603 (1608M) Ferrite)
pins: 1, 2

## HZ1608U181TF
designator FB?  Impedance @ Frequency: 180Ω@100MHz
Ferrite, 180Ω@100MHz, ±25%, 550mΩ, 200mA, SMD 0603; Manufacturer: Sunlord; Manufacturer Part Number: HZ1608U181TF; Package Size: 0603; JLCPCB Basic Part: No; JLCPCB Part Number: C154123; Supplier 1: LCSC; Category: Ferrite Beads; Supplier Part Number 1: C154123; Tolerance: ±25%; Rated Current: 200mA; DC Resistance: 550mΩ; RoHS: Yes; ComponentLink1Description: Datasheet; ComponentLink1URL: https://wmsc.lcsc.com/wmsc/upload/file/pdf/v2/lcsc/2310301640_Sunlord-HZ1608U181TF_C154123.pdf; ComponentLink2Description: JLCPCB Part URL; ComponentLink2URL: https://jlcpcb.com/partdetail/C154123; ComponentLink3Description: LCSC Part URL; ComponentLink3URL: https://lcsc.com/product-detail/Ferrite-Beads_Sunlord-Sunlord-HZ1608U181TF_C154123.html
footprint FB-0603 (0603 (1608M) Ferrite)
pins: 1, 2

## HZ1608U301TF
designator FB?  Impedance @ Frequency: 300Ω@100MHz
Ferrite, 300Ω@100MHz, ±25%, 750mΩ, 200mA, SMD 0603; Manufacturer: Sunlord; Manufacturer Part Number: HZ1608U301TF; Package Size: 0603; JLCPCB Basic Part: No; JLCPCB Part Number: C154124; Supplier 1: LCSC; Category: Ferrite Beads; Supplier Part Number 1: C154124; Tolerance: ±25%; Rated Current: 200mA; DC Resistance: 750mΩ; RoHS: Yes; ComponentLink1Description: Datasheet; ComponentLink1URL: https://wmsc.lcsc.com/wmsc/upload/file/pdf/v2/lcsc/2310301640_Sunlord-HZ1608U301TF_C154124.pdf; ComponentLink2Description: JLCPCB Part URL; ComponentLink2URL: https://jlcpcb.com/partdetail/C154124; ComponentLink3Description: LCSC Part URL; ComponentLink3URL: https://lcsc.com/product-detail/Ferrite-Beads_Sunlord-Sunlord-HZ1608U301TF_C154124.html
footprint FB-0603 (0603 (1608M) Ferrite)
pins: 1, 2

## HZ1608U471TF
designator FB?  Impedance @ Frequency: 470Ω@100MHz
Ferrite, 470Ω@100MHz, ±25%, 850mΩ, 200mA, SMD 0603; Manufacturer: Sunlord; Manufacturer Part Number: HZ1608U471TF; Package Size: 0603; JLCPCB Basic Part: No; JLCPCB Part Number: C154125; Supplier 1: LCSC; Category: Ferrite Beads; Supplier Part Number 1: C154125; Tolerance: ±25%; Rated Current: 200mA; DC Resistance: 850mΩ; RoHS: Yes; ComponentLink1Description: Datasheet; ComponentLink1URL: https://wmsc.lcsc.com/wmsc/upload/file/pdf/v2/lcsc/2310301640_Sunlord-HZ1608U471TF_C154125.pdf; ComponentLink2Description: JLCPCB Part URL; ComponentLink2URL: https://jlcpcb.com/partdetail/C154125; ComponentLink3Description: LCSC Part URL; ComponentLink3URL: https://lcsc.com/product-detail/Ferrite-Beads_Sunlord-Sunlord-HZ1608U471TF_C154125.html
footprint FB-0603 (0603 (1608M) Ferrite)
pins: 1, 2

## HZ1608U601TF
designator FB?  Impedance @ Frequency: 600Ω@100MHz
Ferrite, 600Ω@100MHz, ±25%, 1Ω, 200mA, SMD 0603; Manufacturer: Sunlord; Manufacturer Part Number: HZ1608U601TF; Package Size: 0603; JLCPCB Basic Part: No; JLCPCB Part Number: C154126; Supplier 1: LCSC; Category: Ferrite Beads; Supplier Part Number 1: C154126; Tolerance: ±25%; Rated Current: 200mA; DC Resistance: 1Ω; RoHS: Yes; ComponentLink1Description: Datasheet; ComponentLink1URL: https://wmsc.lcsc.com/wmsc/upload/file/pdf/v2/lcsc/2310301640_Sunlord-HZ1608U601TF_C154126.pdf; ComponentLink2Description: JLCPCB Part URL; ComponentLink2URL: https://jlcpcb.com/partdetail/C154126; ComponentLink3Description: LCSC Part URL; ComponentLink3URL: https://lcsc.com/product-detail/Ferrite-Beads_Sunlord-Sunlord-HZ1608U601TF_C154126.html
footprint FB-0603 (0603 (1608M) Ferrite)
pins: 1, 2

## ILBB0603ER102V
designator FB?  Impedance @ Frequency: 1kΩ@100MHz
Ferrite, 1kΩ@100MHz, ±25%, 600mΩ, 100mA, SMD 0603; Manufacturer: Vishay Intertech; Manufacturer Part Number: ILBB0603ER102V; Package Size: 0603; JLCPCB Basic Part: No; JLCPCB Part Number: C335604; Supplier 1: LCSC; Category: Ferrite Beads; Supplier Part Number 1: C335604; Tolerance: ±25%; Rated Current: 100mA; DC Resistance: 600mΩ; RoHS: Yes; ComponentLink1Description: Datasheet; ComponentLink1URL: https://wmsc.lcsc.com/wmsc/upload/file/pdf/v2/lcsc/2304140030_Vishay-Intertech-ILBB0603ER102V_C335604.pdf; ComponentLink2Description: JLCPCB Part URL; ComponentLink2URL: https://jlcpcb.com/partdetail/C335604; ComponentLink3Description: LCSC Part URL; ComponentLink3URL: https://lcsc.com/product-detail/Ferrite-Beads_Vishay-Intertech-Vishay-Intertech-ILBB0603ER102V_C335604.html
footprint FB-0603 (0603 (1608M) Ferrite)
pins: 1, 2

## ILHB0603ER121V
designator FB?  Impedance @ Frequency: 120Ω@100MHz
Ferrite, 120Ω@100MHz, ±25%, 100mΩ, 2A, SMD 0603; Manufacturer: Vishay Intertech; Manufacturer Part Number: ILHB0603ER121V; Package Size: 0603; JLCPCB Basic Part: No; JLCPCB Part Number: C845116; Supplier 1: LCSC; Category: Ferrite Beads; Supplier Part Number 1: C845116; Tolerance: ±25%; Rated Current: 2A; DC Resistance: 100mΩ; RoHS: Yes; ComponentLink1Description: Datasheet; ComponentLink1URL: https://wmsc.lcsc.com/wmsc/upload/file/pdf/v2/lcsc/2110210930_Vishay-Intertech-ILHB0603ER121V_C845116.pdf; ComponentLink2Description: JLCPCB Part URL; ComponentLink2URL: https://jlcpcb.com/partdetail/C845116; ComponentLink3Description: LCSC Part URL; ComponentLink3URL: https://lcsc.com/product-detail/Ferrite-Beads_Vishay-Intertech-Vishay-Intertech-ILHB0603ER121V_C845116.html
footprint FB-0603 (0603 (1608M) Ferrite)
pins: 1, 2

## KMZ1608BHR102CTD25
designator FB?  Impedance @ Frequency: 1000Ω@100MHz
Ferrite, 1000Ω@100MHz, ±25%, 600mΩ, 300mA, SMD 0603; Manufacturer: TDK; Manufacturer Part Number: KMZ1608BHR102CTD25; Package Size: 0603; JLCPCB Basic Part: No; JLCPCB Part Number: C2661769; Supplier 1: LCSC; Category: Ferrite Beads; Supplier Part Number 1: C2661769; Tolerance: ±25%; Rated Current: 300mA; DC Resistance: 600mΩ; RoHS: Yes; ComponentLink1Description: Datasheet; ComponentLink1URL: https://wmsc.lcsc.com/wmsc/upload/file/pdf/v2/lcsc/2304140030_TDK-KMZ1608BHR102CTD25_C2661769.pdf; ComponentLink2Description: JLCPCB Part URL; ComponentLink2URL: https://jlcpcb.com/partdetail/C2661769; ComponentLink3Description: LCSC Part URL; ComponentLink3URL: https://lcsc.com/product-detail/Ferrite-Beads_TDK-TDK-KMZ1608BHR102CTD25_C2661769.html
footprint FB-0603 (0603 (1608M) Ferrite)
pins: 1, 2

## KMZ1608RHR600ATD25
designator FB?  Impedance @ Frequency: 60Ω@100MHz
Ferrite, 60Ω@100MHz, ±25%, 100mΩ, 800mA, SMD 0603; Manufacturer: TDK; Manufacturer Part Number: KMZ1608RHR600ATD25; Package Size: 0603; JLCPCB Basic Part: No; JLCPCB Part Number: C2661730; Supplier 1: LCSC; Category: Ferrite Beads; Supplier Part Number 1: C2661730; Tolerance: ±25%; Rated Current: 800mA; DC Resistance: 100mΩ; RoHS: Yes; ComponentLink1Description: Datasheet; ComponentLink1URL: https://wmsc.lcsc.com/wmsc/upload/file/pdf/v2/lcsc/2304140030_TDK-KMZ1608RHR600ATD25_C2661730.pdf; ComponentLink2Description: JLCPCB Part URL; ComponentLink2URL: https://jlcpcb.com/partdetail/C2661730; ComponentLink3Description: LCSC Part URL; ComponentLink3URL: https://lcsc.com/product-detail/Ferrite-Beads_TDK-TDK-KMZ1608RHR600ATD25_C2661730.html
footprint FB-0603 (0603 (1608M) Ferrite)
pins: 1, 2

## KMZ1608YHR601BTD25
designator FB?  Impedance @ Frequency: 600Ω@100MHz
Ferrite, 600Ω@100MHz, ±25%, 400mΩ, 500mA, SMD 0603; Manufacturer: TDK; Manufacturer Part Number: KMZ1608YHR601BTD25; Package Size: 0603; JLCPCB Basic Part: No; JLCPCB Part Number: C432982; Supplier 1: LCSC; Category: Ferrite Beads; Supplier Part Number 1: C432982; Tolerance: ±25%; Rated Current: 500mA; DC Resistance: 400mΩ; RoHS: Yes; ComponentLink1Description: Datasheet; ComponentLink1URL: https://wmsc.lcsc.com/wmsc/upload/file/pdf/v2/lcsc/1912111437_TDK-KMZ1608YHR601BTD25_C432982.pdf; ComponentLink2Description: JLCPCB Part URL; ComponentLink2URL: https://jlcpcb.com/partdetail/C432982; ComponentLink3Description: LCSC Part URL; ComponentLink3URL: https://lcsc.com/product-detail/Ferrite-Beads_TDK-TDK-KMZ1608YHR601BTD25_C432982.html
footprint FB-0603 (0603 (1608M) Ferrite)
pins: 1, 2

## KPZ1608SHR221ATD25
designator FB?  Impedance @ Frequency: 220Ω@100MHz
Ferrite, 220Ω@100MHz, ±25%, 50mΩ, 2.2A, SMD 0603; Manufacturer: TDK; Manufacturer Part Number: KPZ1608SHR221ATD25; Package Size: 0603; JLCPCB Basic Part: No; JLCPCB Part Number: C2683169; Supplier 1: LCSC; Category: Ferrite Beads; Supplier Part Number 1: C2683169; Tolerance: ±25%; Rated Current: 2.2A; DC Resistance: 50mΩ; RoHS: Yes; ComponentLink1Description: Datasheet; ComponentLink1URL: https://wmsc.lcsc.com/wmsc/upload/file/pdf/v2/lcsc/2106070404_TDK-KPZ1608SHR221ATD25_C2683169.pdf; ComponentLink2Description: JLCPCB Part URL; ComponentLink2URL: https://jlcpcb.com/partdetail/C2683169; ComponentLink3Description: LCSC Part URL; ComponentLink3URL: https://lcsc.com/product-detail/Ferrite-Beads_TDK-TDK-KPZ1608SHR221ATD25_C2683169.html
footprint FB-0603 (0603 (1608M) Ferrite)
pins: 1, 2
